# Altium footprint library SG__PCB_HOLE_Connector.PcbLib: 174 footprints (part 5 of 11)
Each footprint in its own frame and in the unit in brackets; x right, y up, seen from the top. Pads: shape width x height; smd on the part's side, far side on the other; paste and mask are expansions set on the pad; w line width, h text height; cw(c..) or ccw(c..) is an arc to the next point about the centre after c.
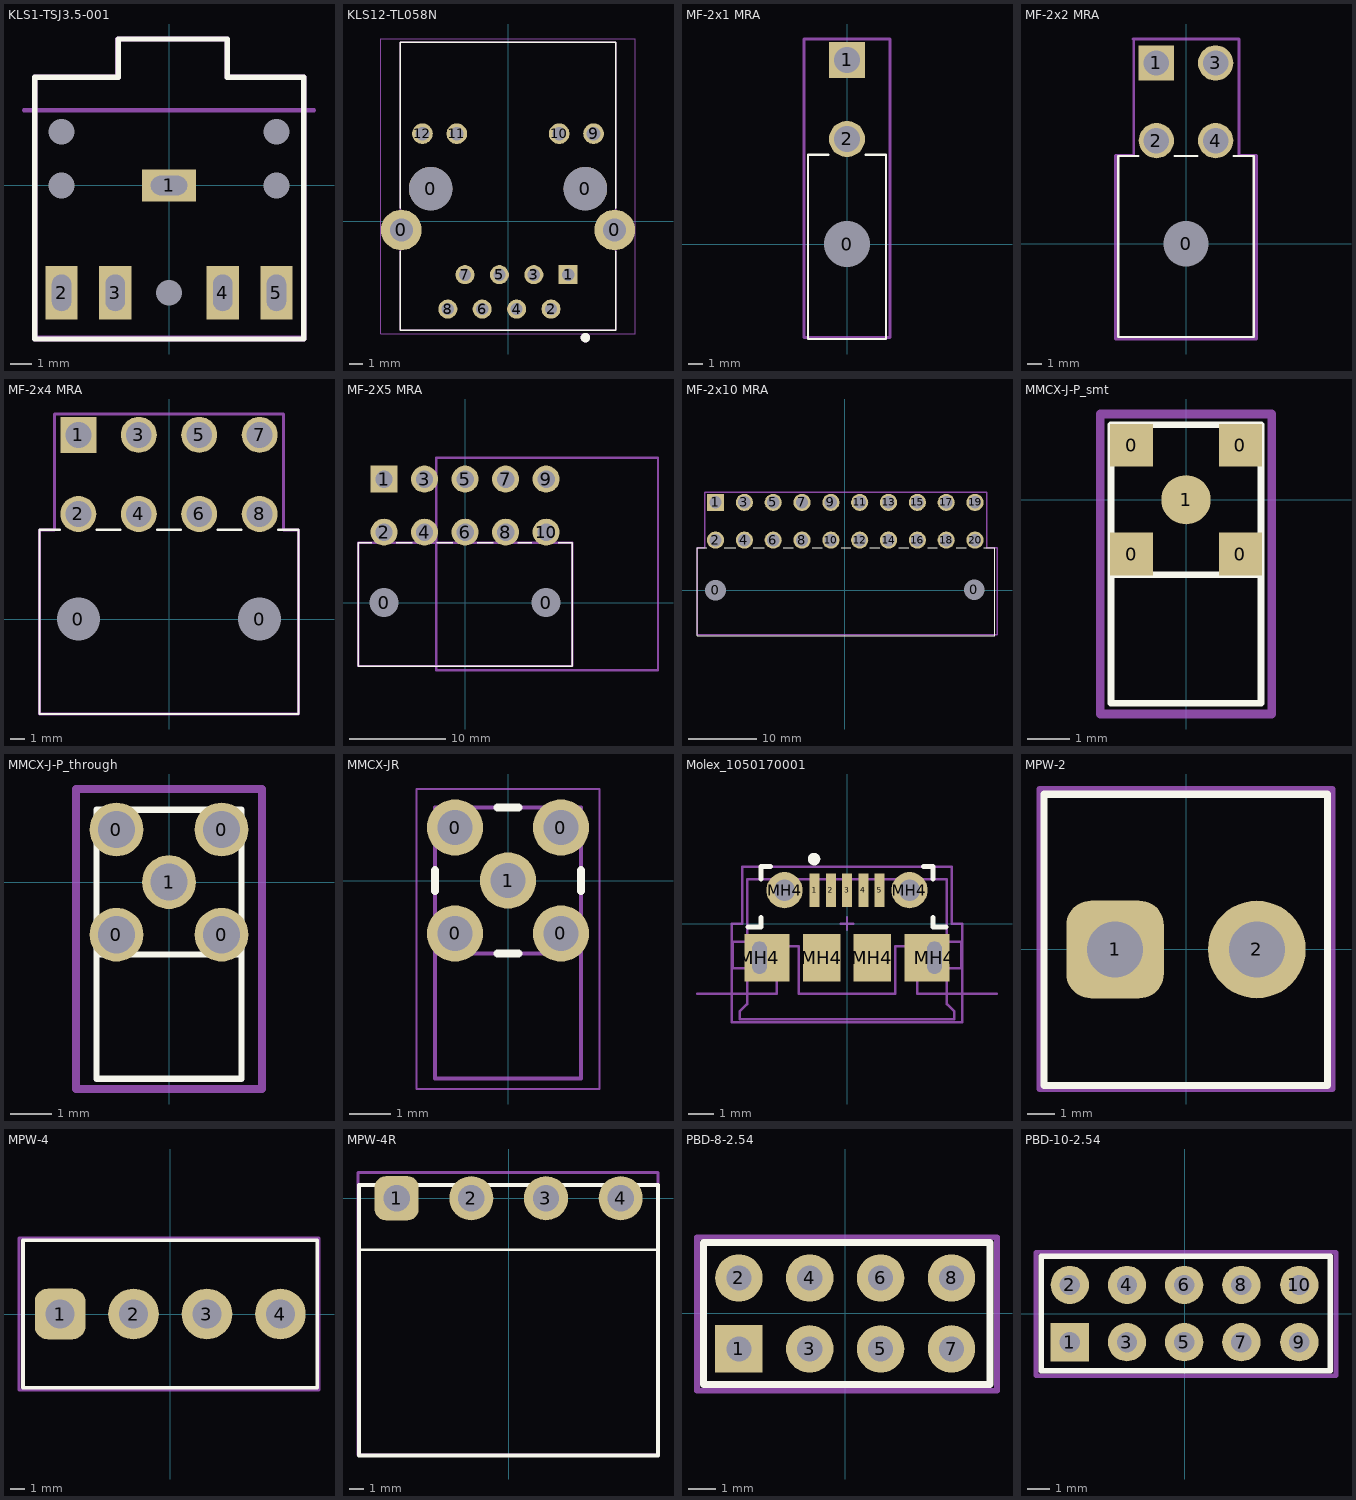
[diagram p4: the footprints below, top view; thin cyan lines are the x and y axes]

## KLS1-TSJ3.5-001 [mm] "Audio jack 3.5mm horizontal connector"
pads (10):
  rect 2.5x1.5 hole 0.9 slot 1.7 at 0 deg: 1(0,0)
  rect 1.5x2.5 hole 0.9 slot 1.7 at 90 deg: 2(-5,-5) 3(-2.5,-5) 4(2.5,-5) 5(5,-5)
  round 0 hole 1.2 unplated: 4(-5,0) 4(-5,2.5) 4(0,-5) 4(5,0) 4(5,2.5)
Top Overlay:
  lines w0.254: -6.25,-7.151 6.27,-7.151 6.27,5.041 2.714,5.041 2.714,6.819 -2.366,6.819 -2.366,5.041 -6.25,5.041 -6.25,-7.151
Top Assembly:
  lines w0.2: -6.75,3.5 6.75,3.5
  lines w0.254: -6.25,-7.151 6.27,-7.151 6.27,5.041 2.714,5.041 2.714,6.819 -2.366,6.819 -2.366,5.041 -6.25,5.041 -6.25,-7.151
  text "Board edge" at -3.35,3.917 h0.8
Top Courtyard:
  lines w0.2: -6.25,-7.099 6.27,-7.099 6.27,5.041 2.714,5.041 2.714,6.819 -2.411,6.819 -2.411,5.041 -6.25,5.041 -6.25,-7.099
3D body "jack 3-5.stp": height 5.5, standoff -3, extent -6.032,-7.161 5.968,6.839

## KLS12-TL058N [mm] "Ethernet connector"
pads (16):
  round 3 hole 1.7: 0(-7.875,-0.635) 0(7.875,-0.635)
  round 3.2 hole 3.2 unplated: 0(-5.715,2.415) 0(5.715,2.415)
  rect 1.408x1.408 hole 0.9: 1(4.445,-3.935)
  round 1.408 hole 0.9: 2(3.175,-6.475) 3(1.905,-3.935) 4(0.635,-6.475) 5(-0.635,-3.935) 6(-1.905,-6.475) 7(-3.175,-3.935) 8(-4.445,-6.475)
  round 1.53 hole 1.02: 9(6.32,6.475) 10(3.78,6.475) 11(-3.78,6.475) 12(-6.32,6.475)
Top Overlay:
  circle w0.5: c5.715,-8.585 r0.1
  lines w0.127: -7.965,-2.23 -7.965,-8.035 7.965,-8.035 7.965,-2.23 ; -7.965,0.96 -7.965,13.215 7.965,13.215 7.965,0.96
Top Assembly:
  circle w0.5: c5.715,-8.585 r0.1
  lines w0.127: -7.965,-8.035 7.965,-8.035 7.965,13.215 -7.965,13.215 -7.965,-8.035
Top Courtyard:
  lines w0.05: -9.4,-8.285 -9.4,13.465 9.4,13.465 9.4,-8.285 -9.4,-8.285
3D body "User Library-KLS12-TL058N.step": height 14.31, standoff -3.95, extent -8.948,-8.182 8.81,13.118

## MF-2x1 MRA [mm]
height 12
pads (3):
  round 2.5 hole 3.2 unplated mask+0.05: 0(0,0)
  rect 2.5x2.5 hole 1.8 mask+0.05: 1(0,12.8)
  round 2.5 hole 1.8 mask+0.05: 2(0,7.3)
Top Overlay:
  lines w0.15: -1.275,6.2 -2.7,6.2 -2.7,-6.6 2.7,-6.6 2.7,6.2 1.275,6.2
Top Courtyard:
  lines w0.2: -3,-6.5 -3,14.25 3,14.25 3,-6.5 -3,-6.5
3D body "Mini-Fit 2 pin.STEP": height 11.4, standoff -3.6, extent -2.9,-6.643 2.9,13.292

## MF-2x2 MRA [mm]
height 12
pads (5):
  round 2.5 hole 3.2 unplated mask+0.05: 0(0,0)
  rect 2.5x2.5 hole 1.8 mask+0.05: 1(-2.1,12.8)
  round 2.5 hole 1.8 mask+0.05: 2(-2.1,7.3) 3(2.1,12.8) 4(2.1,7.3)
Top Overlay:
  lines w0.15: -3.375,6.2 -4.8,6.2 -4.8,-6.6 0.6,-6.6 ; -0.825,6.2 0.6,6.2 ; -0.6,-6.6 4.8,-6.6 4.8,6.2 3.375,6.2 ; -0.6,6.2 0.825,6.2
Top Courtyard:
  lines w0.2: -5,-6.75 -5,6.25 -3.704,6.25 -3.704,14.5 -3.75,14.5 3.75,14.5 3.75,6.25 5,6.25 5,-6.75 -5,-6.75
3D body "Mini-Fit 4pin (MF-4MRA).STEP": height 11.4, standoff -3.6, extent -4.85,-6.66 5.15,13.275

## MF-2x4 MRA [mm]
height 12
pads (10):
  round 2.5 hole 3 unplated mask+0.05: 0(-6.3,0) 0(6.3,0)
  rect 2.5x2.5 hole 1.8 mask+0.05: 1(-6.3,12.8)
  round 2.5 hole 1.8 mask+0.05: 2(-6.3,7.3) 3(-2.1,12.8) 4(-2.1,7.3) 5(2.1,12.8) 6(2.1,7.3) 7(6.3,12.8) 8(6.3,7.3)
Top Overlay:
  lines w0.15: -7.575,6.2 -9,6.2 -9,-6.6 -3.6,-6.6 ; -5.025,6.2 -3.6,6.2 ; -4.8,-6.6 0.6,-6.6 ; -4.8,6.2 -3.375,6.2 ; -0.825,6.2 0.6,6.2 ; -0.6,-6.6 4.8,-6.6 ; -0.6,6.2 0.825,6.2 ; 3.375,6.2 4.8,6.2 ; 3.6,-6.6 9,-6.6 9,6.2 7.575,6.2 ; 3.6,6.2 5.025,6.2
Top Courtyard:
  lines w0.2: -9,-6.6 9,-6.6 9,6.2 7.95,6.2 7.95,14.25 -7.95,14.25 -7.95,6.2 -9,6.2 -9,-6.6
3D body "Mini-Fit 2 pin.STEP": height 11.4, standoff -3.6, extent -9.2,-6.643 -3.4,13.292
3D body "Mini-Fit 2 pin.STEP": height 11.4, standoff -3.6, extent -5,-6.643 0.8,13.292
3D body "Mini-Fit 2 pin.STEP": height 11.4, standoff -3.6, extent -0.8,-6.643 5,13.292
3D body "Mini-Fit 2 pin.STEP": height 11.4, standoff -3.6, extent 3.4,-6.643 9.2,13.292

## MF-2X5 MRA [mm]
height 12
pads (12):
  round 2.5 hole 3 unplated mask+0.05: 0(-8.4,0) 0(8.4,0)
  rect 2.8x2.8 hole 1.8 mask+0.05: 1(-8.4,12.8)
  round 2.8 hole 1.8 mask+0.05: 2(-8.4,7.3) 3(-4.2,12.8) 4(-4.2,7.3) 5(0,12.8) 6(0,7.3) 7(4.2,12.8) 8(4.2,7.3) 9(8.4,12.8) 10(8.4,7.3)
Top Overlay:
  lines w0.15: -9.675,6.2 -11.1,6.2 -11.1,-6.6 -5.7,-6.6 ; -7.125,6.2 -5.7,6.2 ; -6.9,-6.6 -1.5,-6.6 ; -6.9,6.2 -5.475,6.2 ; -2.925,6.2 -1.5,6.2 ; -2.7,-6.6 2.7,-6.6 ; -2.7,6.2 -1.275,6.2 ; 1.275,6.2 2.7,6.2 ; 1.5,-6.6 11.1,-6.6 11.1,6.2 9.675,6.2 ; 1.5,6.2 2.925,6.2 ; 5.475,6.2 6.9,6.2 5.475,6.2
Top Assembly:
  lines w0.254: -11.075,-6.574 -11.075,6.195 11.091,6.195 11.091,-6.574 -11.075,-6.574
Top Courtyard:
  lines w0.254: -3,-7 20,-7 20,15 -3,15 -3,-7
3D body "Mini-Fit 2 pin.STEP": height 11.4, standoff -3.6, extent -11.3,-6.643 -5.5,13.292
3D body "Mini-Fit 2 pin.STEP": height 11.4, standoff -3.6, extent -7.1,-6.643 -1.3,13.292
3D body "Mini-Fit 2 pin.STEP": height 11.4, standoff -3.6, extent -2.9,-6.643 2.9,13.292
3D body "Mini-Fit 2 pin.STEP": height 11.4, standoff -3.6, extent 1.3,-6.643 7.1,13.292
3D body "Mini-Fit 2 pin.STEP": height 11.4, standoff -3.6, extent 5.5,-6.643 11.3,13.292

## MF-2x10 MRA [mm]
height 12
pads (22):
  round 2.5 hole 3 unplated mask+0.05: 0(-18.85,0) 0(18.85,0.1)
  rect 2.5x2.5 hole 1.8 mask+0.05: 1(-18.85,12.8)
  round 2.5 hole 1.8 mask+0.05: 2(-18.85,7.3) 3(-14.65,12.8) 4(-14.65,7.3) 5(-10.45,12.8) 6(-10.45,7.3) 7(-6.25,12.8) 8(-6.25,7.3) 9(-2.05,12.8) 10(-2.05,7.3) 11(2.15,12.8) 12(2.15,7.3) 13(6.35,12.8) 14(6.35,7.3) 15(10.55,12.8) 16(10.55,7.3) 17(14.75,12.8) 18(14.75,7.3) 19(18.95,12.8) 20(18.95,7.3)
Top Overlay:
  lines w0.15: -20.125,6.2 -21.55,6.2 -21.55,-6.6 -16.15,-6.6 ; -17.575,6.2 -16.15,6.2 ; -17.35,-6.6 -11.95,-6.6 ; -17.35,6.2 -15.925,6.2 ; -13.375,6.2 -11.95,6.2 ; -13.15,-6.6 -7.75,-6.6 ; -13.15,6.2 -11.725,6.2 ; -8.95,-6.6 21.85,-6.6 21.85,6.2 20.25,6.2 ; -8.95,6.2 -7.525,6.2 ; -4.75,6.2 -3.325,6.2 ; -0.55,6.2 0.875,6.2 ; 3.65,6.2 5.075,6.2 ; 7.85,6.2 9.275,6.2 ; 12.05,6.2 13.475,6.2 ; 16.25,6.2 17.675,6.2
Top Courtyard:
  lines w0.2: -21.55,-6.447 22.15,-6.447 22.15,6.2 20.65,6.2 20.65,14.25 -20.415,14.25 -20.415,6.2 -21.55,6.2 -21.55,-6.447
3D body "mf2x10.stp": height 11.4, standoff -3.6, extent -21.55,-6.535 22.05,13.4

## MMCX-J-P_smt [mm] "rf con"
pads (5):
  rect 1x1 smd: 0(-1.27,-1.27) 0(-1.27,1.27) 0(1.27,-1.27) 0(1.27,1.27)
  round 1.15 smd: 1(0,0)
Top Overlay:
  lines w0.152: -1.75,-1.75 1.75,-1.75 ; -1.75,-4.75 1.75,-4.75 1.75,1.75 -1.75,1.75 -1.75,-4.75
Top Courtyard:
  lines w0.2: -2,-5 2,-5 2,2 -2,2 -2,-5
3D body: height 4.6, standoff 0, extent -1.75,-1.75 1.75,1.75
3D body: height 4.6, standoff 1.1, extent -1.75,-4.75 1.75,-1.75

## MMCX-J-P_through [mm] "rf con"
pads (5):
  round 1.3 hole 0.9: 0(-1.27,-1.27) 0(-1.27,1.27) 0(1.27,-1.27) 0(1.27,1.27) 1(0,0)
Top Overlay:
  lines w0.152: -1.75,-1.75 1.75,-1.75 ; -1.75,-4.75 1.75,-4.75 1.75,1.75 -1.75,1.75 -1.75,-4.75
Top Courtyard:
  lines w0.2: -2.25,-5 -2.25,2.25 2.25,2.25 2.25,-5 -2.25,-5
3D body: height 4.6, standoff 0, extent -1.75,-1.75 1.75,1.75
3D body: height 4.6, standoff 1.1, extent -1.75,-4.75 1.75,-1.75

## MMCX-JR [mm]
pads (5):
  round 1.348 hole 0.84: 0(-1.27,-1.27) 0(-1.27,1.27) 0(1.27,-1.27) 0(1.27,1.27) 1(0,0)
Top Overlay:
  lines w0.2: -1.75,-0.25 -1.75,0.25 ; -0.25,-1.75 0.25,-1.75 ; -0.25,1.75 0.25,1.75 ; 1.75,-0.25 1.75,0.25
Top Assembly:
  lines w0.1: -1.75,-1.75 1.75,-1.75 ; -1.75,-1.75 -1.75,1.75 1.75,1.75 1.75,-1.75 ; -1.75,-1.75 -1.75,-4.75 1.75,-4.75 1.75,-1.75
Top Courtyard:
  lines w0.05: -2.195,-5 -2.195,2.195 2.195,2.195 2.195,-5 -2.195,-5
3D body "MMCX-J-P-H-RA-TH1.stp": height 5.75, standoff -1.05, extent -1.75,-4.75 1.75,1.75

## Molex_1050170001 [mm] "USB Micro-B Connector"
height 2.667
pads (11):
  rect 0.4x1.35 smd: 1(-1.3,1.35) 2(-0.65,1.35) 3(0,1.35) 4(0.65,1.35) 5(1.3,1.35)
  rect 1.8x1.9 hole 0.6 slot 1.3 at 90 deg copper offset 0.3,0: MH4(-3.5,-1.35)
  round 1.45 hole 0.85: MH4(-2.5,1.35) MH4(2.5,1.35)
  rect 1.5x1.9 smd: MH4(-1,-1.35) MH4(1,-1.35)
  rect 1.8x1.9 hole 0.6 slot 1.3 at 90 deg copper offset -0.3,0: MH4(3.5,-1.35)
Top Overlay:
  circle w0.25: c-1.319,2.595 r0.125
  lines w0.2: -3.953,-0.115 -3.445,-0.115 -3.445,0.266 ; -3.445,1.79 -3.445,2.298 -3.064,2.298 ; 3.064,2.298 3.445,2.298 3.445,1.79 ; 3.445,0.266 3.445,-0.115 3.953,-0.115
Top Assembly:
  lines w0.1: -4,1.792 -4,-0.708 -4.572,-0.708 -4.572,-1.766 -4,-1.766 -4,-3.208 -4.3,-3.508 -4.3,-3.808 4.3,-3.808 4.3,-3.508 4,-3.208 4,-1.766 4.572,-1.766 4.572,-0.708 4,-0.708 4,1.792 ; -4,1.792 4,1.792 ; -4,1.792 4,1.792
Dimensions:
  lines w0.1: -6,-2.788 -2.82,-2.788 -2.82,-0.888 -1.92,-0.888 -1.92,-2.788 0,-2.788 1.92,-2.788 1.92,-0.888 2.82,-0.888 2.82,-2.788 6,-2.788
  text "Board edge" at 5.588,-2.655 h0.2
Top Courtyard:
  lines w0.1: -4.2,2.287 4.2,2.287 ; -4.2,2.29 -4.2,0.012 -4.6,0.012 -4.6,-2.788 -4.6,-3.925 4.6,-3.925 4.6,-2.788 4.6,0.012 4.2,0.012 4.2,2.29 ; -0.254,0.012 0.254,0.012 ; 0,-0.242 0,0.266
3D body "1050170001.stp": height 2.58, standoff -0.72, extent -4.1,-3.857 4.1,1.543

## MPW-2 [mm]
height 12
pads (2):
  rrect50% 3.5x3.5 hole 2: 1(-2.54,0)
  round 3.5 hole 2: 2(2.54,0)
Top Overlay:
  lines w0.254: -5.085,-4.877 5.075,-4.877 5.075,5.563 -5.085,5.563 -5.085,-4.877
Top Courtyard:
  lines w0.2: -5.25,-5 5.25,-5 5.25,5.75 -5.25,5.75 -5.25,-5
3D body "User Library-MPW-2.step": height 14.17, standoff -3.23, extent -5.055,-4.851 5.105,5.603

## MPW-4 [mm]
height 12
pads (4):
  rrect50% 3.5x3.5 hole 2: 1(-7.62,0)
  round 3.5 hole 2: 2(-2.54,0) 3(2.54,0) 4(7.62,0)
Top Overlay:
  lines w0.254: 10.135,-5.105 -10.185,-5.105 -10.185,5.095 10.16,5.095 10.16,-5.105
Top Courtyard:
  lines w0.2: -10.335,5.25 10.29,5.25 10.29,-5.25 -10.46,-5.25 -10.46,5.25 -10.21,5.25
3D body "MPW-4 (DS1074-4 M).STEP": height 14, standoff -3.5, extent -10.174,-4.939 10.146,5.147

## MPW-4R [mm]
height 12
pads (4):
  rrect50% 3x3 hole 1.8: 1(-7.62,0)
  round 3 hole 1.8: 2(-2.54,0) 3(2.54,0) 4(7.62,0)
Top Overlay:
  lines w0.152: -10.185,-3.5 10.16,-3.5
  lines w0.254: -10.185,-17.5 -10.185,0.9 10.16,0.9 10.16,-17.5 -10.185,-17.5
Top Courtyard:
  lines w0.2: -10.25,-17.45 10.16,-17.45 10.16,1.75 -10.25,1.75 -10.25,-17.45
3D body "MPW-4R (DS1074-4 MR).STEP": height 10.09, standoff -3.7, extent -10.181,-17.553 10.139,0.517

## PBD-8-2.54 [mm]
pads (8):
  rect 1.7x1.7 hole 0.9: 1(-3.81,-1.27)
  round 1.7 hole 0.9: 2(-3.81,1.27) 3(-1.27,-1.27) 4(-1.27,1.27) 5(1.27,-1.27) 6(1.27,1.27) 7(3.81,-1.27) 8(3.81,1.27)
Top Overlay:
  lines w0.254: -5.08,-2.54 -5.08,2.54 5.19,2.54 5.19,-2.54 -5.08,-2.54
Top Courtyard:
  lines w0.2: -5.31,-2.77 -5.31,2.73 5.44,2.73 5.44,-2.77 -5.31,-2.77
3D body "PBS1-2.54.stp": height 9, standoff -2.65, extent 0,0 2.54,2.54
3D body "PBS1-2.54.stp": height 9, standoff -2.65, extent 0,-2.54 2.54,0
3D body "PBS1-2.54.stp": height 9, standoff -2.65, extent 2.54,-2.54 5.08,0
3D body "PBS1-2.54.stp": height 9, standoff -2.65, extent 2.54,0 5.08,2.54
3D body "PBS1-2.54.stp": height 9, standoff -2.65, extent -2.54,0 0,2.54
3D body "PBS1-2.54.stp": height 9, standoff -2.65, extent -2.54,-2.54 0,0
3D body "PBS1-2.54.stp": height 9, standoff -2.65, extent -5.08,-2.54 -2.54,0
3D body "PBS1-2.54.stp": height 9, standoff -2.65, extent -5.08,0 -2.54,2.54

## PBD-10-2.54 [mm]
pads (10):
  rect 1.7x1.7 hole 0.9: 1(-5.096,-1.27)
  round 1.7 hole 0.9: 2(-5.096,1.27) 3(-2.556,-1.27) 4(-2.556,1.27) 5(-0.016,-1.27) 6(-0.016,1.27) 7(2.524,-1.27) 8(2.524,1.27) 9(5.096,-1.27) 10(5.096,1.27)
Top Overlay:
  lines w0.254: -6.366,-2.54 6.476,-2.54 6.476,2.54 -6.366,2.54 -6.366,-2.54
Top Courtyard:
  lines w0.2: -6.596,-2.77 6.726,-2.77 6.726,2.73 -6.596,2.73 -6.596,-2.77
3D body "PBS1-2.54.stp": height 9, standoff -2.65, extent 3.826,0 6.366,2.54
3D body "PBS1-2.54.stp": height 9, standoff -2.65, extent 3.826,-2.54 6.366,0
3D body "PBS1-2.54.stp": height 9, standoff -2.65, extent -6.366,0 -3.826,2.54
3D body "PBS1-2.54.stp": height 9, standoff -2.65, extent -6.366,-2.54 -3.826,0
3D body "PBS1-2.54.stp": height 9, standoff -2.65, extent -3.826,-2.54 -1.286,0
3D body "PBS1-2.54.stp": height 9, standoff -2.65, extent -3.826,0 -1.286,2.54
3D body "PBS1-2.54.stp": height 9, standoff -2.65, extent 1.254,0 3.794,2.54
3D body "PBS1-2.54.stp": height 9, standoff -2.65, extent 1.254,-2.54 3.794,0
3D body "PBS1-2.54.stp": height 9, standoff -2.65, extent -1.286,-2.54 1.254,0
3D body "PBS1-2.54.stp": height 9, standoff -2.65, extent -1.286,0 1.254,2.54